# Altium footprint library DIP Connector.PcbLib: 66 footprints (part 3 of 5)
Each footprint in its own frame and in the unit in brackets; x right, y up, seen from the top. Pads: shape width x height; smd on the part's side, far side on the other; paste and mask are expansions set on the pad; w line width, h text height; cw(c..) or ccw(c..) is an arc to the next point about the centre after c.
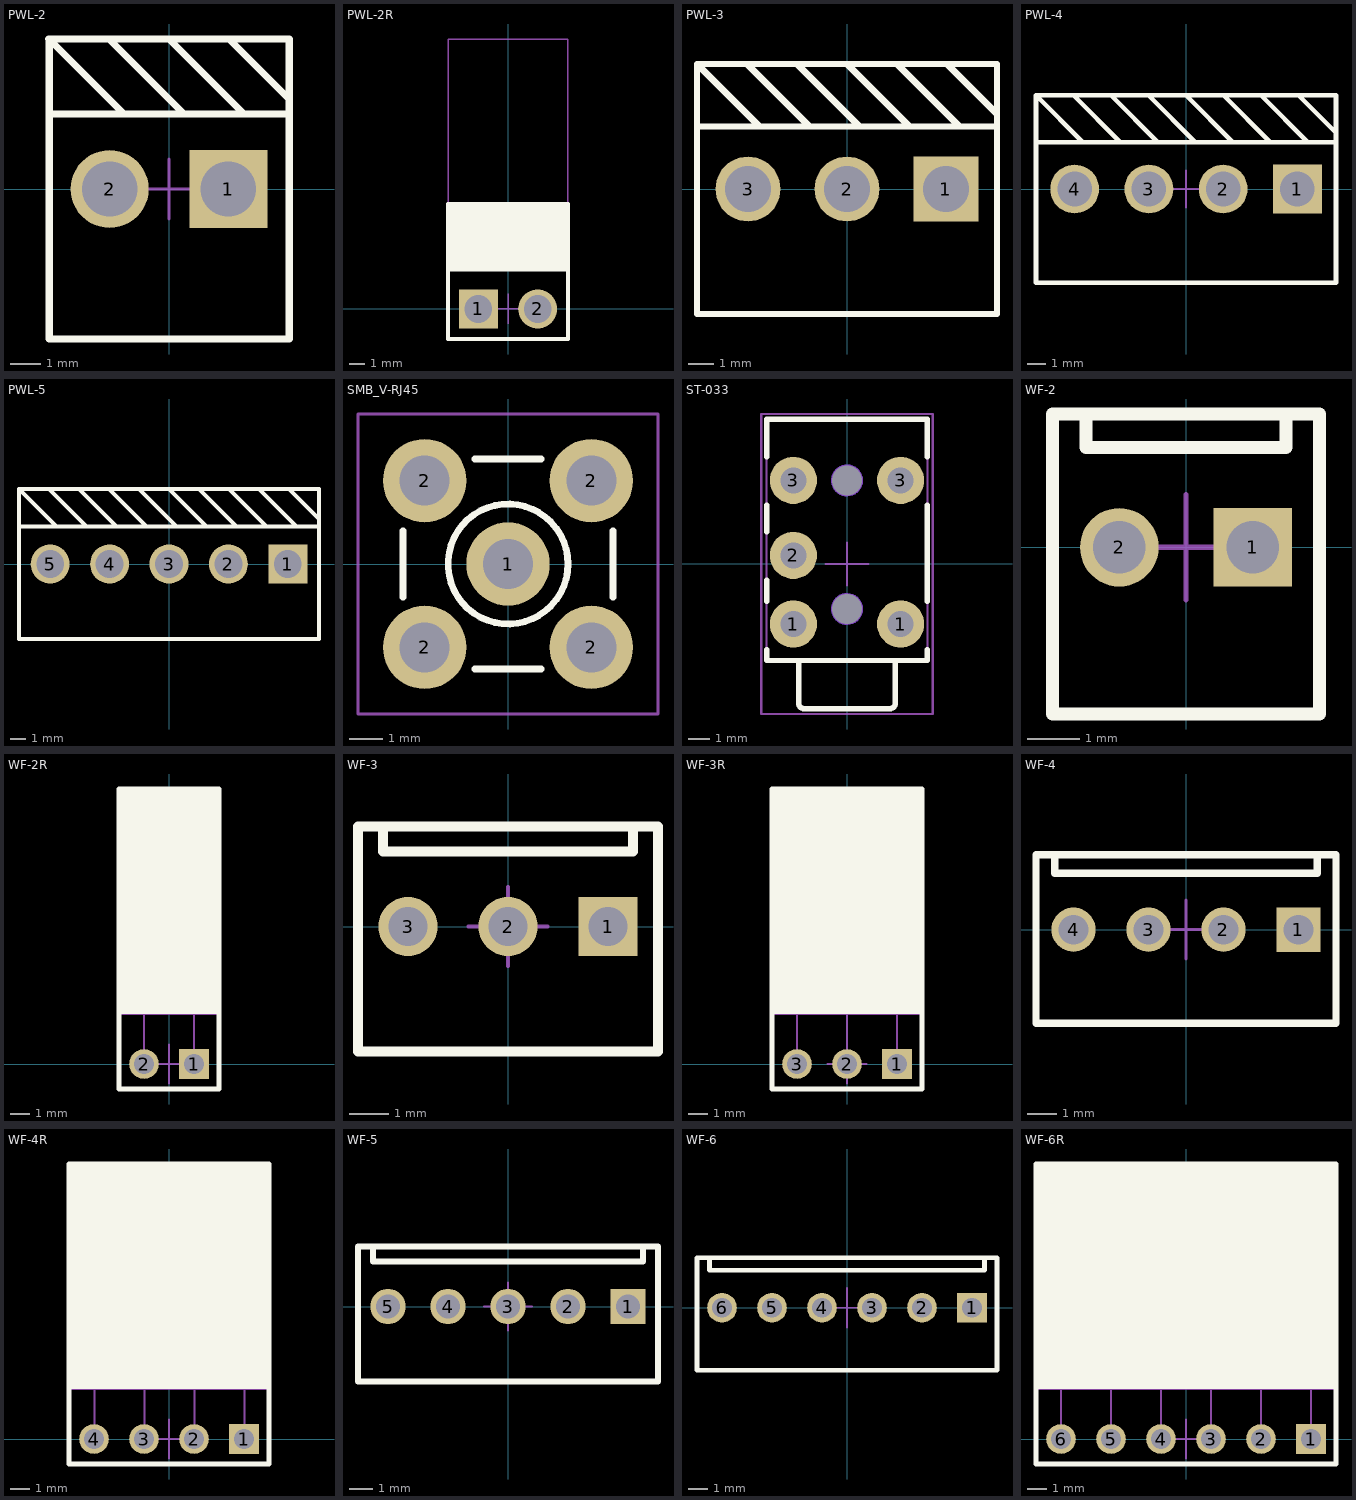
[diagram p2: the footprints below, top view; thin cyan lines are the x and y axes]

## PWL-2 [mm] "Connector; Header; 2 Position"
height 0.001
pads (2):
  rect 2.6x2.6 hole 1.85: 1(1.98,0)
  round 2.6 hole 1.85: 2(-1.98,0)
Top Overlay:
  lines w0.25: -4,2.5 4,2.5 ; -2,5 0.5,2.5 ; -1.5,2.5 -4,5 ; 0,5 2.5,2.5 ; 2,5 4,3 ; -4,5 4,5 4,-5 -4,-5 -4,5
Mechanical 13:
  lines w0.1: -4,2.5 4,2.5 ; -4,-5 -4,5 4,5 4,-5 -4,-5
Mechanical 15:
  lines w0.1: -1,0 1,0 ; 0,-1 0,1 ; -4,-5 -4,5 4,5 4,-5 -4,-5
3D body "PWL-2.stp": height 13.7, standoff -3.8, extent -3.96,-5 3.96,5

## PWL-2R [mm] "Connector; Header; 2 Position"
height 8.5
pads (2):
  rect 2.6x2.6 hole 1.85: 1(-1.98,0)
  round 2.6 hole 1.85: 2(1.98,0)
Top Overlay:
  rectangle: -4,2.5 4,6.97
  lines w0.25: -4,-2 -4,7 4,7 4,-2 -4,-2
Mechanical 15:
  lines w0.1: -1,0 1,0 ; 0,-1 0,1 ; -4,-2 4,-2 4,18 -4,18 -4,-2
3D body "PWL-2R.STEP": height 10.6, standoff -3.4, extent -3.95,-0.5 3.95,17.97

## PWL-3 [mm] "Connector; Header; 3 Position"
height 0.001
pads (3):
  rect 2.6x2.6 hole 1.85: 1(3.96,0)
  round 2.6 hole 1.85: 2(0,0) 3(-3.96,0)
Top Overlay:
  lines w0.25: -6,2.5 6,2.5 ; -4,5 -1.5,2.5 ; -3.5,2.5 -6,5 ; -2,5 0.5,2.5 ; 0,5 2.5,2.5 ; 2,5 4.5,2.5 ; 4,5 6,3 ; -6,5 -6,-5 6,-5 6,5 -6,5
Mechanical 13:
  lines w0.1: -6,2.5 6,2.5 ; -6,-5 6,-5 6,5 -6,5 -6,-5
Mechanical 15:
  lines w0.1: -1,0 1,0 ; 0,-1 0,1 ; -6,-5 6,-5 6,5 -6,5 -6,-5
3D body "PWL-3.stp": height 13.7, standoff -3.8, extent -5.94,-5 5.94,5

## PWL-4 [mm] "Connector; Header; 4 Position"
height 0.001
pads (4):
  rect 2.6x2.6 hole 1.85: 1(5.94,0)
  round 2.6 hole 1.85: 2(1.98,0) 3(-1.98,0) 4(-5.94,0)
Top Overlay:
  lines w0.25: -8,2.5 8,2.5 ; -6,5 -3.5,2.5 ; -5.5,2.5 -8,5 ; -4,5 -1.5,2.5 ; -2,5 0.5,2.5 ; 0,5 2.5,2.5 ; 2,5 4.5,2.5 ; 4,5 6.5,2.5 ; 6,5 8,3 ; -8,5 -8,-5 8,-5 8,5 -8,5
Mechanical 13:
  lines w0.1: -8,2.5 8,2.5 ; -8,-5 8,-5 8,5 -8,5 -8,-5
Mechanical 15:
  lines w0.1: -1,0 1,0 ; 0,-1 0,1 ; -8,-5 8,-5 8,5 -8,5 -8,-5
3D body "PWL-4.stp": height 13.7, standoff -3.8, extent -7.92,-5 7.92,5

## PWL-5 [mm] "Connector; Header; 5 Position"
height 0.001
pads (5):
  rect 2.6x2.6 hole 1.85: 1(7.92,0)
  round 2.6 hole 1.85: 2(3.96,0) 3(0,0) 4(-3.96,0) 5(-7.92,0)
Top Overlay:
  lines w0.25: -10,2.5 10,2.5 ; -8,5 -5.5,2.5 ; -7.5,2.5 -10,5 ; -6,5 -3.5,2.5 ; -4,5 -1.5,2.5 ; -2,5 0.5,2.5 ; 0,5 2.5,2.5 ; 2,5 4.5,2.5 ; 4,5 6.5,2.5 ; 6,5 8.5,2.5 ; 8,5 10,3 ; -10,5 -10,-5 10,-5 10,5 -10,5
Mechanical 13:
  lines w0.1: -10,2.5 10,2.5 ; -10,-5 10,-5 10,5 -10,5 -10,-5
Mechanical 15:
  lines w0.1: -1,0 1,0 ; 0,-1 0,1 ; -10,-5 10,-5 10,5 -10,5 -10,-5
3D body "PWL-5.stp": height 13.7, standoff -3.8, extent -9.9,-5 9.9,5

## SMB_V-RJ45 [mm]
pads (5):
  round 2.5 hole 1.5: 1(0,0) 2(-2.5,-2.5) 2(-2.5,2.5) 2(2.5,-2.5) 2(2.5,2.5)
Top Overlay:
  circle w0.2: c0,0 r1.8
  lines w0.2: -3.15,-1 -3.15,1 ; -1,-3.15 1,-3.15 ; -1,3.15 1,3.15 ; 3.15,-1 3.15,1
Mechanical 1:
  circle w0.025: c0,0 r0.2
  circle w0.025: c0,0 r1.05
  circle w0.025: c0,0 r1.8
Mechanical 15:
  lines w0.1: -1,0 1,0 ; 0,-1 0,1 ; -4.5,-4.5 -4.5,4.5 4.5,4.5 4.5,-4.5 -4.5,-4.5

## ST-033 [mm]
height 7
pads (7):
  round 0.1 hole 1.4 unplated: 0(0,-2.1) 0(0,3.9)
  round 2.2 hole 1.2: 1(-2.5,-2.8) 1(2.5,-2.8) 2(-2.5,0.4) 3(-2.5,3.9) 3(2.5,3.9)
Top Layer keep-out:
  circle w0.1: c0,3.9 r0.7
  circle w0.1: c0,-2.1 r0.7
Bottom Layer keep-out:
  circle w0.1: c0,-2.1 r0.7
  circle w0.1: c0,3.9 r0.7
Top Overlay:
  lines w0.25: -3.75,-4 -3.75,-4.5 3.75,-4.5 3.75,-4 ; -3.75,-1.75 -3.75,-0.75 ; -3.75,1.5 -3.75,2.75 ; -3.75,5 -3.75,6.75 3.75,6.75 3.75,5 ; -2.25,-4.5 -2.25,-6.5 ccw(c-2,-6.5) -2,-6.75 2,-6.75 ccw(c2,-6.5) 2.25,-6.5 2.25,-4.5 ; 3.75,-1.75 3.75,2.75
Mechanical 13:
  lines w0.1: -2.25,-4.5 -2.25,-6.5 ccw(c-2,-6.5) -2,-6.75 2,-6.75 ccw(c2,-6.5) 2.25,-6.5 2.25,-4.5 ; -3.75,-4.5 3.75,-4.5 3.75,6.75 -3.75,6.75 -3.75,-4.5
Mechanical 15:
  lines w0.1: -1,0 1,0 ; 0,-1 0,1 ; -4,-7 4,-7 4,7 -4,7 -4,-7

## WF-2 [mm]
height 11.4
pads (2):
  rect 1.5x1.5 hole 1: 1(1.27,0)
  round 1.5 hole 1: 2(-1.27,0)
Top Overlay:
  lines w0.25: -1.905,2.54 -1.905,1.905 1.905,1.905 1.905,2.54 ; -2.54,-3.175 2.54,-3.175 2.54,2.54 -2.54,2.54 -2.54,-3.175
Mechanical 13:
  lines w0.1: -1.905,2.54 -1.905,1.905 1.905,1.905 1.905,2.54 ; -2.54,-3.175 -2.54,2.54 2.54,2.54 2.54,-3.175 -2.54,-3.175
Mechanical 15:
  lines w0.1: -1,0 1,0 ; 0,-1 0,1 ; -2.54,-3.175 2.54,-3.175 2.54,2.54 -2.54,2.54 -2.54,-3.175
3D body "User Library-CI31_2.step": height 11.76, standoff -3.04, extent -2.54,-3.175 2.54,2.625

## WF-2R [mm]
height 5.8
pads (2):
  rect 1.5x1.5 hole 1: 1(1.27,0)
  round 1.5 hole 1: 2(-1.27,0)
Top Overlay:
  rectangle: -2.54,2.54 2.54,13.97
  lines w0.25: -2.54,-1.27 2.54,-1.27 2.54,13.97 -2.54,13.97 -2.54,-1.27
Mechanical 13:
  lines w0.1: -1.905,4.445 -1.905,13.335 1.905,13.335 1.905,4.445 ; -1.27,0 -1.27,2.54 ; 1.27,0 1.27,2.54 ; -2.54,4.445 -2.54,2.54 2.54,2.54 2.54,4.445 ; -2.54,4.445 2.54,4.445 ; -2.54,4.445 -2.54,13.97 2.54,13.97 2.54,4.445
Mechanical 15:
  lines w0.1: -1,0 1,0 ; 0,-1 0,1 ; -2.54,-1.27 2.54,-1.27 2.54,2.54 -2.54,2.54 -2.54,-1.27

## WF-3 [mm]
height 11.4
pads (3):
  rect 1.5x1.5 hole 1: 1(2.54,0)
  round 1.5 hole 1: 2(0,0) 3(-2.54,0)
Top Overlay:
  lines w0.25: -3.175,2.54 -3.175,1.905 3.175,1.905 3.175,2.54 ; -3.81,-3.175 3.81,-3.175 3.81,2.54 -3.81,2.54 -3.81,-3.175
Mechanical 13:
  lines w0.1: -3.175,2.54 -3.175,1.905 3.175,1.905 3.175,2.54 ; -3.81,-3.175 -3.81,2.54 3.81,2.54 3.81,-3.175 -3.81,-3.175
Mechanical 15:
  lines w0.1: -1,0 1,0 ; 0,-1 0,1 ; -3.81,-3.175 3.81,-3.175 3.81,2.54 -3.81,2.54 -3.81,-3.175
3D body "User Library-CI31_3.step": height 11.76, standoff -3.04, extent -3.81,-3.175 3.81,2.625

## WF-3R [mm]
height 5.8
pads (3):
  rect 1.5x1.5 hole 1: 1(2.54,0)
  round 1.5 hole 1: 2(0,0) 3(-2.54,0)
Top Overlay:
  rectangle: -3.81,2.54 3.81,13.97
  lines w0.25: -3.81,-1.27 -3.81,13.97 3.81,13.97 3.81,-1.27 -3.81,-1.27
Mechanical 13:
  lines w0.1: -3.81,4.445 3.81,4.445 ; -3.175,4.445 -3.175,13.335 3.175,13.335 3.175,4.445 ; -2.54,0 -2.54,2.54 ; 0,0 0,2.54 ; 2.54,0 2.54,2.54 ; -3.81,2.54 3.81,2.54 3.81,13.97 -3.81,13.97 -3.81,2.54
Mechanical 15:
  lines w0.1: -1,0 1,0 ; 0,-1 0,1 ; -3.81,-1.27 -3.81,13.97 3.81,13.97 3.81,-1.27 -3.81,-1.27
3D body "User Library-WF-03MR-1.step": height 6, standoff -2.91, extent -3.8,-0.3 3.8,13.48

## WF-4 [mm]
height 11.4
pads (4):
  rect 1.5x1.5 hole 1: 1(3.81,0)
  round 1.5 hole 1: 2(1.27,0) 3(-1.27,0) 4(-3.81,0)
Top Overlay:
  lines w0.25: -4.445,2.54 -4.445,1.905 4.445,1.905 4.445,2.54 ; -5.08,-3.175 5.08,-3.175 5.08,2.54 -5.08,2.54 -5.08,-3.175
Mechanical 13:
  lines w0.1: -4.445,2.54 -4.445,1.905 4.445,1.905 4.445,2.54 ; -5.08,-3.175 -5.08,2.54 5.08,2.54 5.08,-3.175 -5.08,-3.175
Mechanical 15:
  lines w0.1: -1,0 1,0 ; 0,-1 0,1 ; -5.08,-3.175 5.08,-3.175 5.08,2.54 -5.08,2.54 -5.08,-3.175
3D body "User Library-CI31_4.step": height 11.76, standoff -3.04, extent -5.08,-3.175 5.08,2.625

## WF-4R [mm]
height 5.8
pads (4):
  rect 1.5x1.5 hole 1: 1(3.81,0)
  round 1.5 hole 1: 2(1.27,0) 3(-1.27,0) 4(-3.81,0)
Top Overlay:
  rectangle: -5.08,2.54 5.08,13.97
  lines w0.25: -5.08,-1.27 5.08,-1.27 5.08,13.97 -5.08,13.97 -5.08,-1.27
Mechanical 13:
  lines w0.1: -5.06,4.445 5.08,4.445 ; -4.425,4.445 -4.425,13.335 4.445,13.335 4.445,4.445 ; -3.79,0 -3.79,2.54 ; -1.25,0 -1.25,2.54 ; 1.29,0 1.29,2.54 ; 3.83,0 3.83,2.54 ; -5.06,2.54 -5.06,13.97 5.08,13.97 5.08,2.54 -5.06,2.54
Mechanical 15:
  lines w0.1: -1,0 1,0 ; 0,-1 0,1 ; -5.08,-1.27 5.08,-1.27 5.08,13.97 -5.08,13.97 -5.08,-1.27

## WF-5 [mm]
height 11.4
pads (5):
  rect 1.5x1.5 hole 1: 1(5.08,0)
  round 1.5 hole 1: 2(2.54,0) 3(0,0) 4(-2.54,0) 5(-5.08,0)
Top Overlay:
  lines w0.25: -5.715,2.54 -5.715,1.905 5.715,1.905 5.715,2.54 ; -6.35,-3.175 6.35,-3.175 6.35,2.54 -6.35,2.54 -6.35,-3.175
Mechanical 13:
  lines w0.1: -5.715,2.54 -5.715,1.905 5.715,1.905 5.715,2.54 ; -6.35,-3.175 -6.35,2.54 6.35,2.54 6.35,-3.175 -6.35,-3.175
Mechanical 15:
  lines w0.1: -1,0 1,0 ; 0,-1 0,1 ; -6.35,-3.175 6.35,-3.175 6.35,2.54 -6.35,2.54 -6.35,-3.175
3D body "User Library-CI31_5_new.step": height 11.76, standoff -3.04, extent -6.35,-3.175 6.35,2.625

## WF-6 [mm]
height 11.4
pads (6):
  rect 1.5x1.5 hole 1: 1(6.35,0)
  round 1.5 hole 1: 2(3.81,0) 3(1.27,0) 4(-1.27,0) 5(-3.81,0) 6(-6.35,0)
Top Overlay:
  lines w0.25: -6.985,2.54 -6.985,1.905 6.985,1.905 6.985,2.54 ; -7.62,-3.175 -7.62,2.54 7.62,2.54 7.62,-3.175 -7.62,-3.175
Mechanical 13:
  lines w0.1: -6.985,2.54 -6.985,1.905 6.985,1.905 6.985,2.54 ; -7.62,-3.175 7.62,-3.175 7.62,2.54 -7.62,2.54 -7.62,-3.175
Mechanical 15:
  lines w0.1: -1,0 1,0 ; 0,-1 0,1 ; -7.62,-3.175 -7.62,2.54 7.62,2.54 7.62,-3.175 -7.62,-3.175
3D body "User Library-CI31_6.step": height 11.76, standoff -3.04, extent -7.62,-3.175 7.62,2.625

## WF-6R [mm]
height 5.8
pads (6):
  rect 1.5x1.5 hole 1: 1(6.35,0)
  round 1.5 hole 1: 2(3.81,0) 3(1.27,0) 4(-1.27,0) 5(-3.81,0) 6(-6.35,0)
Top Overlay:
  rectangle: -7.62,2.54 7.62,13.97
  lines w0.25: -7.62,-1.27 7.62,-1.27 7.62,13.97 -7.62,13.97 -7.62,-1.27
Mechanical 13:
  lines w0.1: -7.62,4.445 7.62,4.445 ; -6.985,4.445 -6.985,13.335 6.985,13.335 6.985,4.445 ; -6.35,0 -6.35,2.54 ; -3.81,0 -3.81,2.54 ; -1.27,0 -1.27,2.54 ; 1.27,0 1.27,2.54 ; 3.81,0 3.81,2.54 ; 6.35,0 6.35,2.54 ; -7.62,2.54 -7.62,13.97 7.62,13.97 7.62,2.54 -7.62,2.54
Mechanical 15:
  lines w0.1: -1,0 1,0 ; 0,-1 0,1 ; -7.62,-1.27 7.62,-1.27 7.62,13.97 -7.62,13.97 -7.62,-1.27
3D body "User Library-WF-03MR-1.step": height 6, standoff -2.91, extent 0.01,-0.3 7.61,13.48
3D body "User Library-WF-03MR-1.step": height 6, standoff -2.91, extent -7.61,-0.3 -0.01,13.48